# Altium footprint library ACTION标准库.pcblib: 504 footprints (part 7 of 32)
Each footprint in its own frame and in the unit in brackets; x right, y up, seen from the top. Pads: shape width x height; smd on the part's side, far side on the other; paste and mask are expansions set on the pad; w line width, h text height; cw(c..) or ccw(c..) is an arc to the next point about the centre after c.
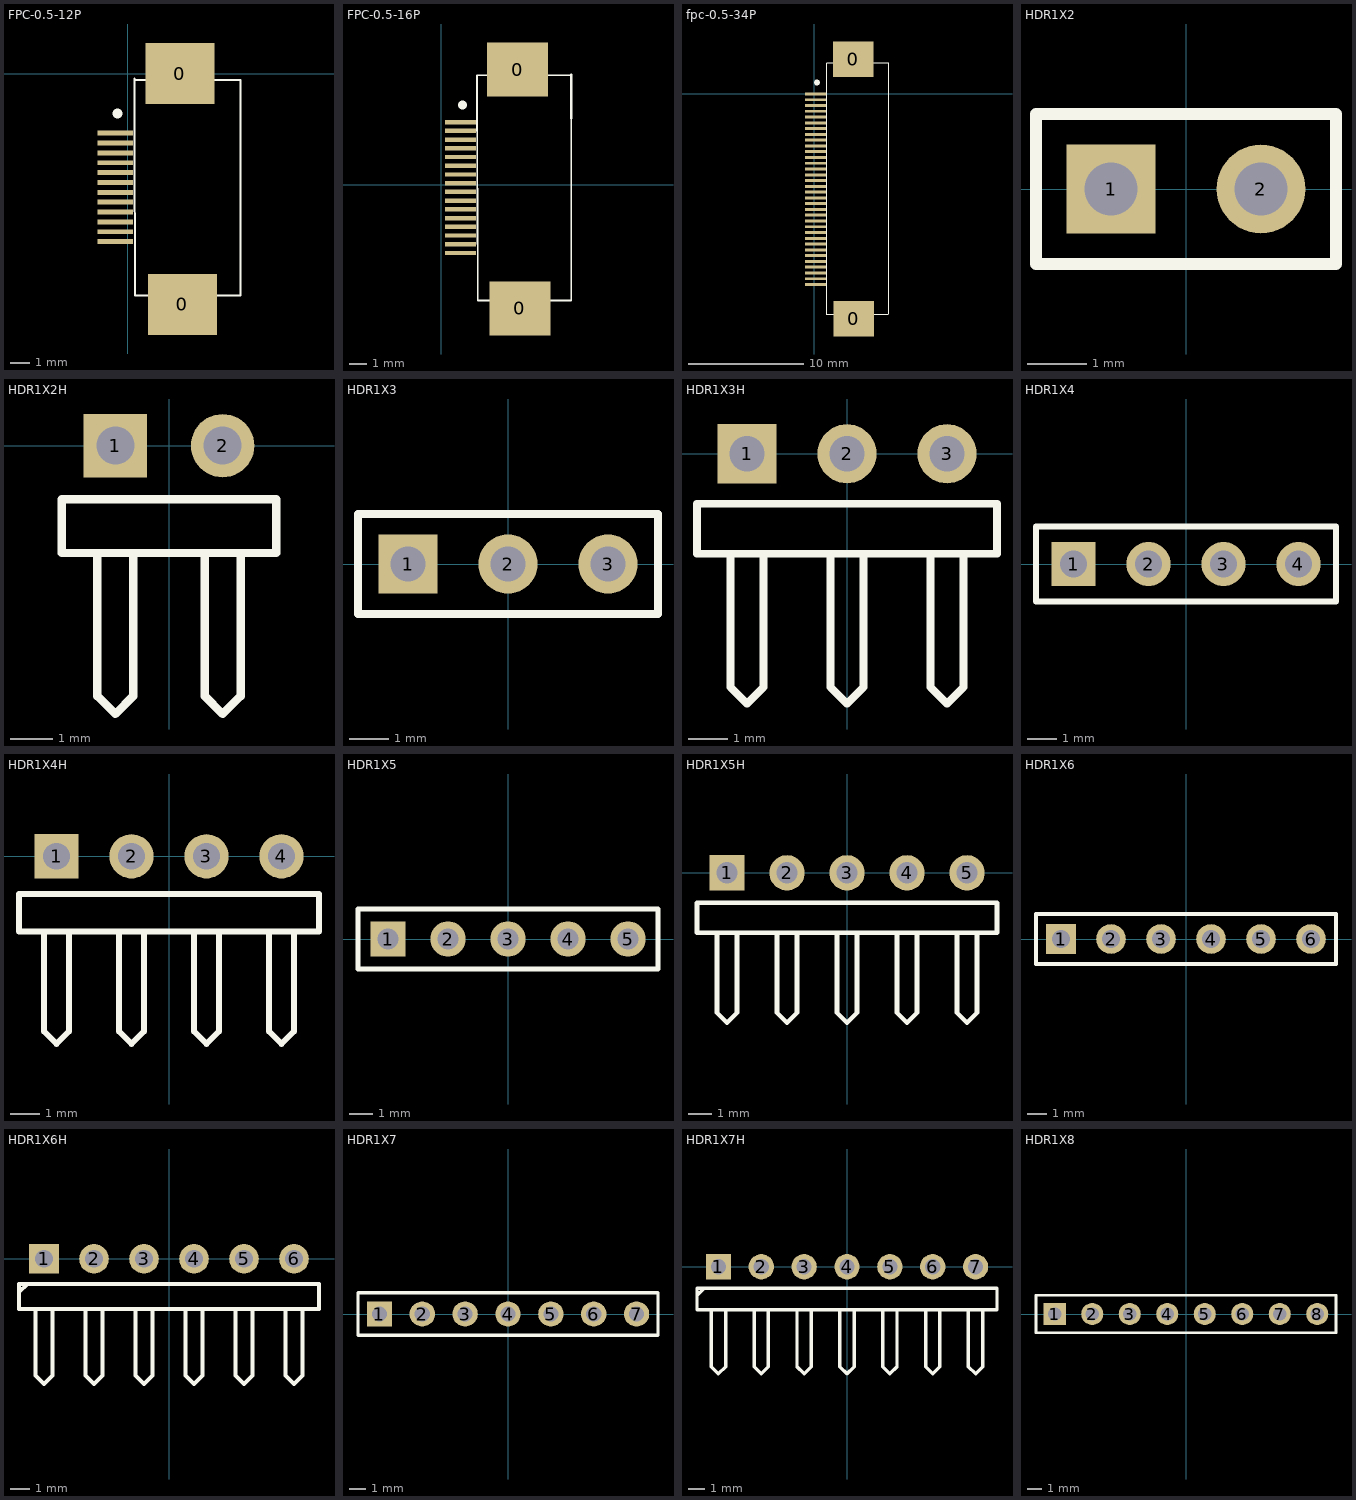
[diagram p6: the footprints below, top view; thin cyan lines are the x and y axes]

## FPC-0.5-12P [mm]
pads (14):
  rect 3.5x3.1 smd: 0(2.642,0) 0(2.769,-11.709)
  rect 1.8x0.25 smd: 1(-0.635,-3.023) 2(-0.635,-3.523) 3(-0.635,-4.023) 4(-0.635,-4.523) 5(-0.635,-5.023) 6(-0.635,-5.523) 7(-0.635,-6.023) 8(-0.635,-6.523) 9(-0.635,-7.023) 10(-0.635,-7.523) 11(-0.635,-8.023) 12(-0.635,-8.523)
Top Overlay:
  lines w0.1: 0.33,-2.972 0.33,-0.254 ; 0.33,-2.819 0.355,-11.252 5.715,-11.252 5.715,-0.33 0.33,-0.33
  lines w0.5: -0.533,-2.032 -0.508,-2.032
3D body "1-1734839-2.stp": height 2.02, standoff -0.03, extent 0.082,-11.455 5.192,-0.025

## FPC-0.5-16P [mm]
pads (18):
  rect 3.5x3.1 smd: 0(4.369,6.599) 0(4.496,-7.112)
  rect 1.8x0.25 smd: 1(1.092,3.576) 2(1.092,3.076) 3(1.092,2.576) 4(1.092,2.076) 5(1.092,1.576) 6(1.092,1.076) 7(1.092,0.576) 8(1.092,0.076) 9(1.092,-0.424) 10(1.092,-0.925) 11(1.092,-1.425) 12(1.092,-1.925) 13(1.092,-2.425) 14(1.092,-2.925) 15(1.092,-3.425) 16(1.092,-3.925)
Top Overlay:
  lines w0.1: 2.044,6.274 2.082,-6.655 7.442,-6.655 7.442,4.267 ; 2.057,6.269 7.442,6.269
  lines w0.127: 7.442,3.8 7.442,6.294
  lines w0.5: 1.194,4.567 1.219,4.567
3D body "FPC-12pin.stp": height 2.07, standoff -0.03, extent 1.676,-7.428 6.776,7.072

## fpc-0.5-34P [mm]
pads (36):
  rect 3.5x3.1 smd: 0(3.378,2.997) 0(3.404,-19.533)
  rect 1.8x0.25 smd: 1(0.102,-0.025) 2(0.102,-0.525) 3(0.102,-1.025) 4(0.102,-1.525) 5(0.102,-2.025) 6(0.102,-2.525) 7(0.102,-3.025) 8(0.102,-3.525) 9(0.102,-4.025) 10(0.102,-4.525) 11(0.102,-5.025) 12(0.102,-5.525) 13(0.102,-6.039) 14(0.102,-6.539) 15(0.102,-7.039) 16(0.102,-7.539) 17(0.102,-8.039) 18(0.102,-8.539) 19(0.102,-9.039) 20(0.102,-9.539) 21(0.102,-10.039) 22(0.102,-10.539) 23(0.102,-11.039) 24(0.102,-11.539) 25(0.101,-12.051) 26(0.101,-12.551) 27(0.101,-13.051) 28(0.101,-13.551) 29(0.101,-14.051) 30(0.101,-14.551) 31(0.101,-15.051) 32(0.101,-15.551) 33(0.101,-16.051) 34(0.101,-16.551)
Top Overlay:
  lines w0.1: 1.041,-19.152 6.426,-19.152 ; 1.067,-19.075 1.067,0.178 ; 1.067,0.025 1.067,2.642 ; 1.067,2.667 6.452,2.667 6.452,-19.101
  lines w0.5: 0.203,0.965 0.229,0.965
3D body "FPC34-0.5MM.stp": height 1.97, standoff -0.08, extent 0.508,-19.495 5.618,2.935

## HDR1X2 [mm] "Connector; Header; 2 Position"
pads (2):
  rect 1.5x1.5 hole 0.9: 1(-1.27,0)
  round 1.5 hole 0.9: 2(1.27,0)
Top Overlay:
  lines w0.2: -2.54,-1.27 2.54,-1.27 2.54,1.27 -2.54,1.27 -2.54,-1.27
3D body "HEADER 2.STEP": height 10.1, standoff -1.5, extent -2.515,-1.295 2.565,1.245

## HDR1X2H [mm] "Connector; Header; 2 Position; Right Angle"
pads (2):
  rect 1.5x1.5 hole 0.9: 1(-1.27,0)
  round 1.5 hole 0.9: 2(1.27,0)
Top Overlay:
  lines w0.2: -1.693,-2.54 -1.693,-5.927 -1.27,-6.35 -0.847,-5.927 -0.847,-2.54 ; 0.847,-2.54 0.847,-5.927 1.27,-6.35 1.693,-5.927 1.693,-2.54 ; -2.54,-2.54 -2.54,-1.27 2.54,-1.27 2.54,-2.54 -2.54,-2.54
3D body "HEADER 2H.STEP": height 4.33, standoff -3, extent -2.565,-7.051 2.515,1.219

## HDR1X3 [mm] "Connector; Header; 3 Position"
pads (3):
  rect 1.5x1.5 hole 0.9: 1(-2.54,0)
  round 1.5 hole 0.9: 2(0,0) 3(2.54,0)
Top Overlay:
  lines w0.2: -3.81,-1.27 -3.81,1.27 3.81,1.27 3.81,-1.27 -3.81,-1.27
3D body "HEADER 3.STEP": height 10.1, standoff -1.5, extent -3.835,-1.245 3.785,1.295

## HDR1X3H [mm] "Connector; Header; 3 Position; Right Angle"
pads (3):
  rect 1.5x1.5 hole 0.9: 1(-2.54,0)
  round 1.5 hole 0.9: 2(0,0) 3(2.54,0)
Top Overlay:
  lines w0.2: -2.963,-2.54 -2.963,-5.927 -2.54,-6.35 -2.117,-5.927 -2.117,-2.54 ; -0.423,-2.54 -0.423,-5.927 0,-6.35 0.423,-5.927 0.423,-2.54 ; 2.117,-2.54 2.117,-5.927 2.54,-6.35 2.963,-5.927 2.963,-2.54 ; -3.81,-2.54 -3.81,-1.27 3.81,-1.27 3.81,-2.54 -3.81,-2.54
3D body "HEADER 3H.STEP": height 4.27, standoff -3.05, extent -3.835,-7.102 3.785,1.168

## HDR1X4 [mm] "Connector; Header; 4 Position"
pads (4):
  rect 1.5x1.5 hole 0.9: 1(-3.81,0)
  round 1.5 hole 0.9: 2(-1.27,0) 3(1.27,0) 4(3.81,0)
Top Overlay:
  lines w0.2: -5.08,-1.27 -5.08,1.27 5.08,1.27 5.08,-1.27 -5.08,-1.27
3D body "HEADER 4.STEP": height 10.1, standoff -1.5, extent -5.08,-1.219 5.08,1.321

## HDR1X4H [mm] "Connector; Header; 4 Position; Right Angle"
pads (4):
  rect 1.5x1.5 hole 0.9: 1(-3.81,0)
  round 1.5 hole 0.9: 2(-1.27,0) 3(1.27,0) 4(3.81,0)
Top Overlay:
  lines w0.2: -4.233,-2.54 -4.233,-5.927 -3.81,-6.35 -3.387,-5.927 -3.387,-2.54 ; -1.693,-2.54 -1.693,-5.927 -1.27,-6.35 -0.847,-5.927 -0.847,-2.54 ; 0.847,-2.54 0.847,-5.927 1.27,-6.35 1.693,-5.927 1.693,-2.54 ; 3.387,-2.54 3.387,-5.927 3.81,-6.35 4.233,-5.927 4.233,-2.54 ; -5.08,-2.54 -5.08,-1.27 5.08,-1.27 5.08,-2.54 -5.08,-2.54
3D body "HEADER 4H.STEP": height 4.33, standoff -3, extent -5.055,-7.025 5.105,1.245

## HDR1X5 [mm] "Connector; Header; 5 Position"
pads (5):
  rect 1.5x1.5 hole 0.9: 1(-5.08,0)
  round 1.5 hole 0.9: 2(-2.54,0) 3(0,0) 4(2.54,0) 5(5.08,0)
Top Overlay:
  lines w0.2: -6.35,-1.27 -6.35,1.27 6.35,1.27 6.35,-1.27 -6.35,-1.27
3D body "HEADER 5.STEP": height 10.1, standoff -1.5, extent -6.35,-1.27 6.35,1.27

## HDR1X5H [mm] "Connector; Header; 5 Position; Right Angle"
pads (5):
  rect 1.5x1.5 hole 0.9: 1(-5.08,0)
  round 1.5 hole 0.9: 2(-2.54,0) 3(0,0) 4(2.54,0) 5(5.08,0)
Top Overlay:
  lines w0.2: -5.503,-2.54 -5.503,-5.927 -5.08,-6.35 -4.657,-5.927 -4.657,-2.54 ; -2.963,-2.54 -2.963,-5.927 -2.54,-6.35 -2.117,-5.927 -2.117,-2.54 ; -0.423,-2.54 -0.423,-5.927 0,-6.35 0.423,-5.927 0.423,-2.54 ; 2.117,-2.54 2.117,-5.927 2.54,-6.35 2.963,-5.927 2.963,-2.54 ; 4.657,-2.54 4.657,-5.927 5.08,-6.35 5.503,-5.927 5.503,-2.54 ; -6.35,-2.54 6.35,-2.54 6.35,-1.27 -6.35,-1.27 -6.35,-2.54
3D body "HEADER 5H.STEP": height 4.33, standoff -3, extent -6.401,-6.975 6.299,1.295

## HDR1X6 [mm] "Connector; Header; 6 Position"
pads (6):
  rect 1.5x1.5 hole 0.9: 1(-6.35,0)
  round 1.5 hole 0.9: 2(-3.81,0) 3(-1.27,0) 4(1.27,0) 5(3.81,0) 6(6.35,0)
Top Overlay:
  lines w0.2: -7.62,-1.27 7.62,-1.27 7.62,1.27 -7.62,1.27 -7.62,-1.27
3D body "HEADER 6.STEP": height 10.1, standoff -1.5, extent -7.569,-1.27 7.671,1.27

## HDR1X6H [mm] "Connector; Header; 6 Position; Right Angle"
pads (6):
  rect 1.5x1.5 hole 0.9: 1(-6.35,0)
  round 1.5 hole 0.9: 2(-3.81,0) 3(-1.27,0) 4(1.27,0) 5(3.81,0) 6(6.35,0)
Top Overlay:
  lines w0.2: -7.62,-1.693 -7.197,-1.27 ; -6.773,-2.54 -6.773,-5.927 -6.35,-6.35 -5.927,-5.927 -5.927,-2.54 ; -4.233,-2.54 -4.233,-5.927 -3.81,-6.35 -3.387,-5.927 -3.387,-2.54 ; -1.693,-2.54 -1.693,-5.927 -1.27,-6.35 -0.847,-5.927 -0.847,-2.54 ; 0.847,-2.54 0.847,-5.927 1.27,-6.35 1.693,-5.927 1.693,-2.54 ; 3.387,-2.54 3.387,-5.927 3.81,-6.35 4.233,-5.927 4.233,-2.54 ; 5.927,-2.54 5.927,-5.927 6.35,-6.35 6.773,-5.927 6.773,-2.54 ; -7.62,-2.54 -7.62,-1.27 7.62,-1.27 7.62,-2.54 -7.62,-2.54
3D body "HEADER 6H.STEP": height 4.33, standoff -3, extent -7.62,-7 7.62,1.27

## HDR1X7 [mm] "Connector; Header; 7 Position"
pads (7):
  rect 1.5x1.5 hole 0.9: 1(-7.62,0)
  round 1.5 hole 0.9: 2(-5.08,0) 3(-2.54,0) 4(0,0) 5(2.54,0) 6(5.08,0) 7(7.62,0)
Top Overlay:
  lines w0.2: -8.89,-1.27 -8.89,1.27 8.89,1.27 8.89,-1.27 -8.89,-1.27
3D body "HEADER 7.STEP": height 10.1, standoff -1.5, extent -8.865,-1.245 8.915,1.295

## HDR1X7H [mm] "Connector; Header; 7 Position; Right Angle"
pads (7):
  rect 1.5x1.5 hole 0.9: 1(-7.62,0)
  round 1.5 hole 0.9: 2(-5.08,0) 3(-2.54,0) 4(0,0) 5(2.54,0) 6(5.08,0) 7(7.62,0)
Top Overlay:
  lines w0.2: -8.89,-1.693 -8.467,-1.27 ; -8.043,-2.54 -8.043,-5.927 -7.62,-6.35 -7.197,-5.927 -7.197,-2.54 ; -5.503,-2.54 -5.503,-5.927 -5.08,-6.35 -4.657,-5.927 -4.657,-2.54 ; -2.963,-2.54 -2.963,-5.927 -2.54,-6.35 -2.117,-5.927 -2.117,-2.54 ; -0.423,-2.54 -0.423,-5.927 0,-6.35 0.423,-5.927 0.423,-2.54 ; 2.117,-2.54 2.117,-5.927 2.54,-6.35 2.963,-5.927 2.963,-2.54 ; 4.657,-2.54 4.657,-5.927 5.08,-6.35 5.503,-5.927 5.503,-2.54 ; 7.197,-2.54 7.197,-5.927 7.62,-6.35 8.043,-5.927 8.043,-2.54 ; -8.89,-2.54 -8.89,-1.27 8.89,-1.27 8.89,-2.54 -8.89,-2.54
3D body "HEADER 7H.STEP": height 4.33, standoff -3, extent -8.89,-6.949 8.89,1.321

## HDR1X8 [mm] "Connector; Header; 8 Position"
pads (8):
  rect 1.5x1.5 hole 0.9: 1(-8.89,0)
  round 1.5 hole 0.9: 2(-6.35,0) 3(-3.81,0) 4(-1.27,0) 5(1.27,0) 6(3.81,0) 7(6.35,0) 8(8.89,0)
Top Overlay:
  lines w0.2: -10.16,-1.27 -10.16,1.27 10.16,1.27 10.16,-1.27 -10.16,-1.27
3D body "HEADER 8.STEP": height 10.1, standoff -1.5, extent -10.16,-1.295 10.16,1.245